# Altium footprint library PcbLib.PcbLib: 141 footprints (part 9 of 9)
Each footprint in its own frame and in the unit in brackets; x right, y up, seen from the top. Pads: shape width x height; smd on the part's side, far side on the other; paste and mask are expansions set on the pad; w line width, h text height; cw(c..) or ccw(c..) is an arc to the next point about the centre after c.
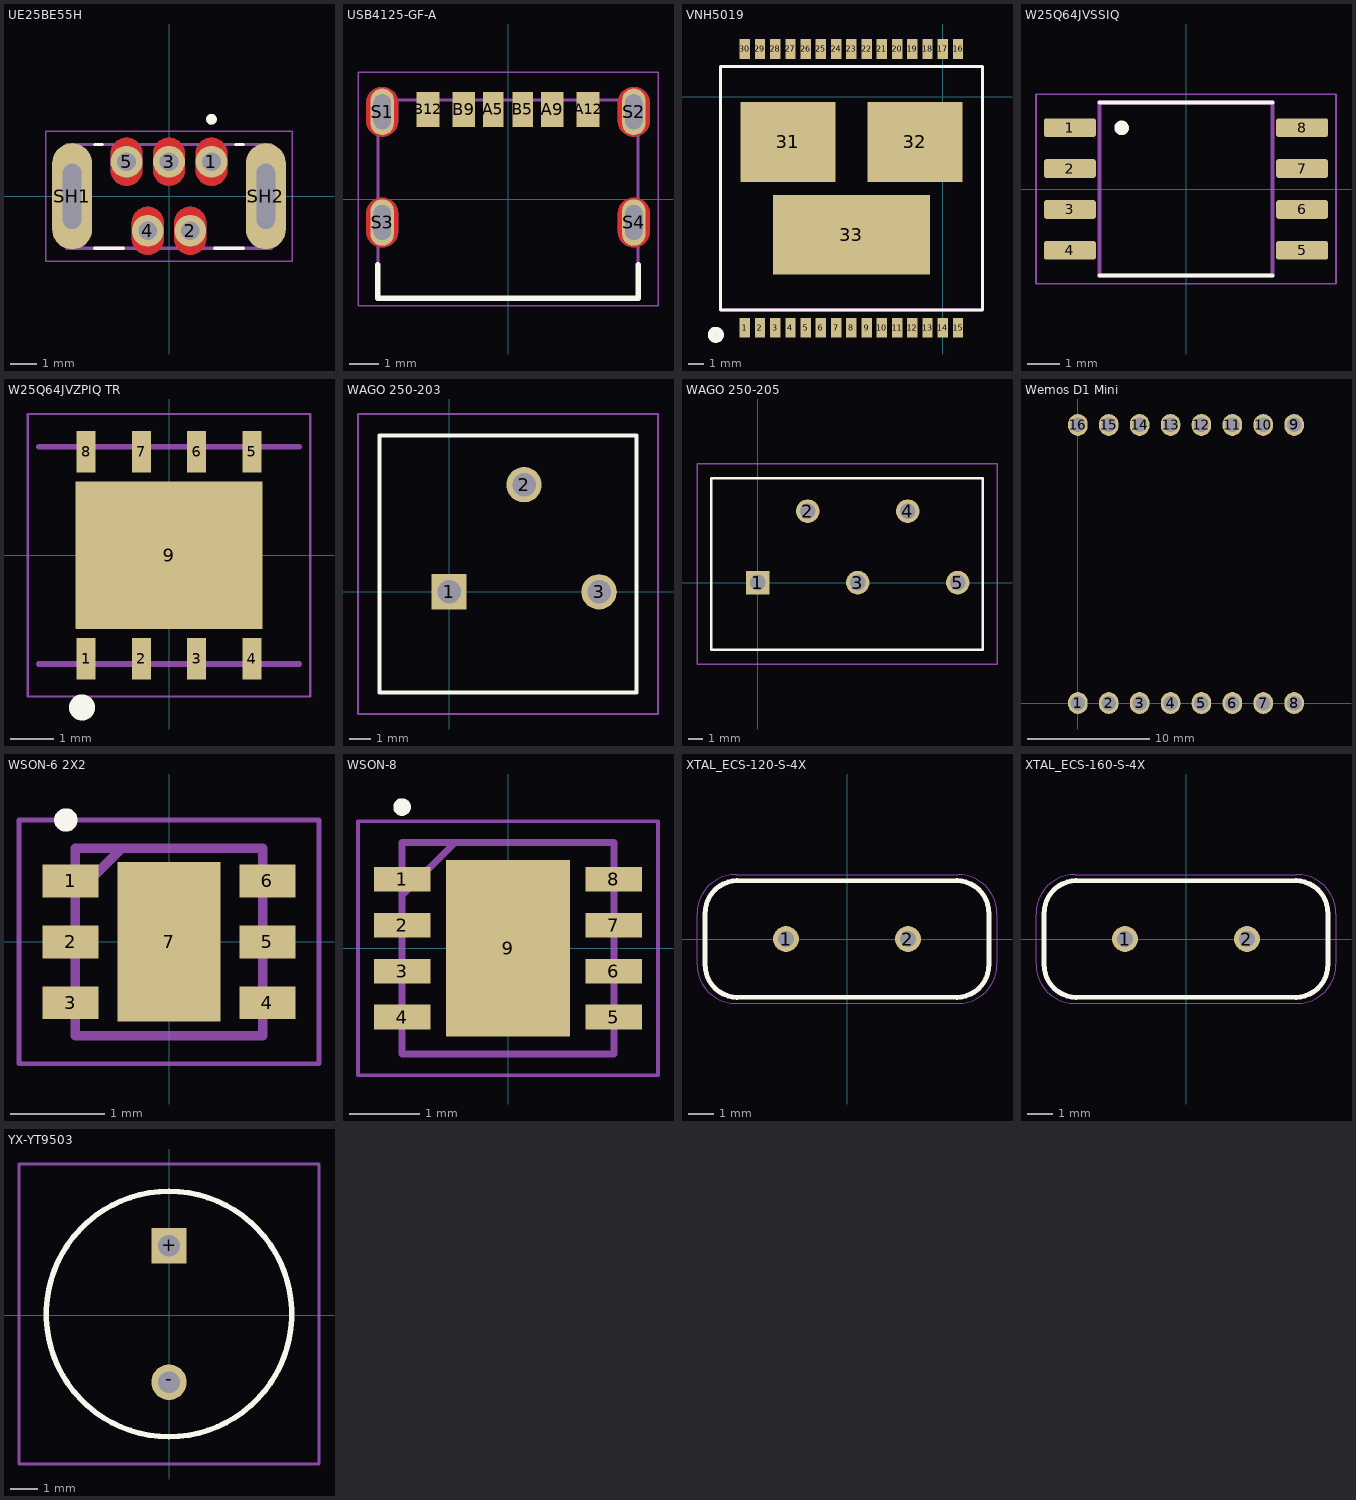
[diagram p8: the footprints below, top view; thin cyan lines are the x and y axes]

## UE25BE55H [mm]
pads (7):
  round 1.2 hole 0.7 mask+0: 1(1.6,1.3) 2(0.8,-1.3) 3(0,1.3) 4(-0.8,-1.3) 5(-1.6,1.3)
  oval 1.5x4 hole 0.7 slot 2.45 at 90 deg: SH1(-3.65,0) SH2(3.65,0)
Top Layer:
  region: 0.831,-0.401 0.863,-0.403 0.894,-0.407 0.925,-0.413 0.955,-0.42 0.985,-0.429 1.015,-0.44 1.044,-0.452 1.072,-0.465 1.1,-0.48 1.127,-0.497 1.153,-0.515 1.178,-0.534 1.201,-0.554 1.224,-0.576 1.246,-0.599 1.266,-0.622 1.285,-0.647 1.303,-0.673 1.32,-0.7 1.335,-0.728 1.348,-0.756 1.36,-0.785 1.371,-0.815 1.38,-0.845 1.387,-0.875 1.393,-0.906 1.397,-0.937 1.399,-0.969 1.4,-1 1.4,-1.6 1.399,-1.631 1.397,-1.663 1.393,-1.694 1.387,-1.725 1.38,-1.755 1.371,-1.785 1.36,-1.815 1.348,-1.844 1.335,-1.872 1.32,-1.9 1.303,-1.927 1.285,-1.953 1.266,-1.978 1.246,-2.001 1.224,-2.024 1.201,-2.046 1.178,-2.066 1.153,-2.085 1.127,-2.103 1.1,-2.12 1.072,-2.135 1.044,-2.148 1.015,-2.16 0.985,-2.171 0.955,-2.18 0.925,-2.187 0.894,-2.193 0.863,-2.197 0.831,-2.199 0.8,-2.2 0.769,-2.199 0.737,-2.197 0.706,-2.193 0.675,-2.187 0.645,-2.18 0.615,-2.171 0.585,-2.16 0.556,-2.148 0.528,-2.135 0.5,-2.12 0.473,-2.103 0.447,-2.085 0.422,-2.066 0.399,-2.046 0.376,-2.024 0.354,-2.001 0.334,-1.978 0.315,-1.953 0.297,-1.927 0.28,-1.9 0.265,-1.872 0.252,-1.844 0.24,-1.815 0.229,-1.785 0.22,-1.755 0.213,-1.725 0.207,-1.694 0.203,-1.663 0.201,-1.631 0.2,-1.6 0.2,-1 0.201,-0.969 0.203,-0.937 0.207,-0.906 0.213,-0.875 0.22,-0.845 0.229,-0.815 0.24,-0.785 0.252,-0.756 0.265,-0.728 0.28,-0.7 0.297,-0.673 0.315,-0.647 0.334,-0.622 0.354,-0.599 0.376,-0.576 0.399,-0.554 0.422,-0.534 0.447,-0.515 0.473,-0.497 0.5,-0.48 0.528,-0.465 0.556,-0.452 0.585,-0.44 0.615,-0.429 0.645,-0.42 0.675,-0.413 0.706,-0.407 0.737,-0.403 0.769,-0.401 0.8,-0.4
  region: -0.769,-0.401 -0.737,-0.403 -0.706,-0.407 -0.675,-0.413 -0.645,-0.42 -0.615,-0.429 -0.585,-0.44 -0.556,-0.452 -0.528,-0.465 -0.5,-0.48 -0.473,-0.497 -0.447,-0.515 -0.422,-0.534 -0.399,-0.554 -0.376,-0.576 -0.354,-0.599 -0.334,-0.622 -0.315,-0.647 -0.297,-0.673 -0.28,-0.7 -0.265,-0.728 -0.252,-0.756 -0.24,-0.785 -0.229,-0.815 -0.22,-0.845 -0.213,-0.875 -0.207,-0.906 -0.203,-0.937 -0.201,-0.969 -0.2,-1 -0.2,-1.6 -0.201,-1.631 -0.203,-1.663 -0.207,-1.694 -0.213,-1.725 -0.22,-1.755 -0.229,-1.785 -0.24,-1.815 -0.252,-1.844 -0.265,-1.872 -0.28,-1.9 -0.297,-1.927 -0.315,-1.953 -0.334,-1.978 -0.354,-2.001 -0.376,-2.024 -0.399,-2.046 -0.422,-2.066 -0.447,-2.085 -0.473,-2.103 -0.5,-2.12 -0.528,-2.135 -0.556,-2.148 -0.585,-2.16 -0.615,-2.171 -0.645,-2.18 -0.675,-2.187 -0.706,-2.193 -0.737,-2.197 -0.769,-2.199 -0.8,-2.2 -0.831,-2.199 -0.863,-2.197 -0.894,-2.193 -0.925,-2.187 -0.955,-2.18 -0.985,-2.171 -1.015,-2.16 -1.044,-2.148 -1.072,-2.135 -1.1,-2.12 -1.127,-2.103 -1.153,-2.085 -1.178,-2.066 -1.201,-2.046 -1.224,-2.024 -1.246,-2.001 -1.266,-1.978 -1.285,-1.953 -1.303,-1.927 -1.32,-1.9 -1.335,-1.872 -1.348,-1.844 -1.36,-1.815 -1.371,-1.785 -1.38,-1.755 -1.387,-1.725 -1.393,-1.694 -1.397,-1.663 -1.399,-1.631 -1.4,-1.6 -1.4,-1 -1.399,-0.969 -1.397,-0.937 -1.393,-0.906 -1.387,-0.875 -1.38,-0.845 -1.371,-0.815 -1.36,-0.785 -1.348,-0.756 -1.335,-0.728 -1.32,-0.7 -1.303,-0.673 -1.285,-0.647 -1.266,-0.622 -1.246,-0.599 -1.224,-0.576 -1.201,-0.554 -1.178,-0.534 -1.153,-0.515 -1.127,-0.497 -1.1,-0.48 -1.072,-0.465 -1.044,-0.452 -1.015,-0.44 -0.985,-0.429 -0.955,-0.42 -0.925,-0.413 -0.894,-0.407 -0.863,-0.403 -0.831,-0.401 -0.8,-0.4
  region: 1.631,2.199 1.663,2.197 1.694,2.193 1.725,2.187 1.755,2.18 1.785,2.171 1.815,2.16 1.844,2.148 1.872,2.135 1.9,2.12 1.927,2.103 1.953,2.085 1.978,2.066 2.001,2.046 2.024,2.024 2.046,2.001 2.066,1.978 2.085,1.953 2.103,1.927 2.12,1.9 2.135,1.872 2.148,1.844 2.16,1.815 2.171,1.785 2.18,1.755 2.187,1.725 2.193,1.694 2.197,1.663 2.199,1.631 2.2,1.6 2.2,1 2.199,0.969 2.197,0.937 2.193,0.906 2.187,0.875 2.18,0.845 2.171,0.815 2.16,0.785 2.148,0.756 2.135,0.728 2.12,0.7 2.103,0.673 2.085,0.647 2.066,0.622 2.046,0.599 2.024,0.576 2.001,0.554 1.978,0.534 1.953,0.515 1.927,0.497 1.9,0.48 1.872,0.465 1.844,0.452 1.815,0.44 1.785,0.429 1.755,0.42 1.725,0.413 1.694,0.407 1.663,0.403 1.631,0.401 1.6,0.4 1.569,0.401 1.537,0.403 1.506,0.407 1.475,0.413 1.445,0.42 1.415,0.429 1.385,0.44 1.356,0.452 1.328,0.465 1.3,0.48 1.273,0.497 1.247,0.515 1.222,0.534 1.199,0.554 1.176,0.576 1.154,0.599 1.134,0.622 1.115,0.647 1.097,0.673 1.08,0.7 1.065,0.728 1.052,0.756 1.04,0.785 1.029,0.815 1.02,0.845 1.013,0.875 1.007,0.906 1.003,0.937 1.001,0.969 1,1 1,1.6 1.001,1.631 1.003,1.663 1.007,1.694 1.013,1.725 1.02,1.755 1.029,1.785 1.04,1.815 1.052,1.844 1.065,1.872 1.08,1.9 1.097,1.927 1.115,1.953 1.134,1.978 1.154,2.001 1.176,2.024 1.199,2.046 1.222,2.066 1.247,2.085 1.273,2.103 1.3,2.12 1.328,2.135 1.356,2.148 1.385,2.16 1.415,2.171 1.445,2.18 1.475,2.187 1.506,2.193 1.537,2.197 1.569,2.199 1.6,2.2
  region: -1.569,2.199 -1.537,2.197 -1.506,2.193 -1.475,2.187 -1.445,2.18 -1.415,2.171 -1.385,2.16 -1.356,2.148 -1.328,2.135 -1.3,2.12 -1.273,2.103 -1.247,2.085 -1.222,2.066 -1.199,2.046 -1.176,2.024 -1.154,2.001 -1.134,1.978 -1.115,1.953 -1.097,1.927 -1.08,1.9 -1.065,1.872 -1.052,1.844 -1.04,1.815 -1.029,1.785 -1.02,1.755 -1.013,1.725 -1.007,1.694 -1.003,1.663 -1.001,1.631 -1,1.6 -1,1 -1.001,0.969 -1.003,0.937 -1.007,0.906 -1.013,0.875 -1.02,0.845 -1.029,0.815 -1.04,0.785 -1.052,0.756 -1.065,0.728 -1.08,0.7 -1.097,0.673 -1.115,0.647 -1.134,0.622 -1.154,0.599 -1.176,0.576 -1.199,0.554 -1.222,0.534 -1.247,0.515 -1.273,0.497 -1.3,0.48 -1.328,0.465 -1.356,0.452 -1.385,0.44 -1.415,0.429 -1.445,0.42 -1.475,0.413 -1.506,0.407 -1.537,0.403 -1.569,0.401 -1.6,0.4 -1.631,0.401 -1.663,0.403 -1.694,0.407 -1.725,0.413 -1.755,0.42 -1.785,0.429 -1.815,0.44 -1.844,0.452 -1.872,0.465 -1.9,0.48 -1.927,0.497 -1.953,0.515 -1.978,0.534 -2.001,0.554 -2.024,0.576 -2.046,0.599 -2.066,0.622 -2.085,0.647 -2.103,0.673 -2.12,0.7 -2.135,0.728 -2.148,0.756 -2.16,0.785 -2.171,0.815 -2.18,0.845 -2.187,0.875 -2.193,0.906 -2.197,0.937 -2.199,0.969 -2.2,1 -2.2,1.6 -2.199,1.631 -2.197,1.663 -2.193,1.694 -2.187,1.725 -2.18,1.755 -2.171,1.785 -2.16,1.815 -2.148,1.844 -2.135,1.872 -2.12,1.9 -2.103,1.927 -2.085,1.953 -2.066,1.978 -2.046,2.001 -2.024,2.024 -2.001,2.046 -1.978,2.066 -1.953,2.085 -1.927,2.103 -1.9,2.12 -1.872,2.135 -1.844,2.148 -1.815,2.16 -1.785,2.171 -1.755,2.18 -1.725,2.187 -1.694,2.193 -1.663,2.197 -1.631,2.199 -1.6,2.2
  region: 0.031,2.199 0.063,2.197 0.094,2.193 0.125,2.187 0.155,2.18 0.185,2.171 0.215,2.16 0.244,2.148 0.272,2.135 0.3,2.12 0.327,2.103 0.353,2.085 0.378,2.066 0.401,2.046 0.424,2.024 0.446,2.001 0.466,1.978 0.485,1.953 0.503,1.927 0.52,1.9 0.535,1.872 0.548,1.844 0.56,1.815 0.571,1.785 0.58,1.755 0.587,1.725 0.593,1.694 0.597,1.663 0.599,1.631 0.6,1.6 0.6,1 0.599,0.969 0.597,0.937 0.593,0.906 0.587,0.875 0.58,0.845 0.571,0.815 0.56,0.785 0.548,0.756 0.535,0.728 0.52,0.7 0.503,0.673 0.485,0.647 0.466,0.622 0.446,0.599 0.424,0.576 0.401,0.554 0.378,0.534 0.353,0.515 0.327,0.497 0.3,0.48 0.272,0.465 0.244,0.452 0.215,0.44 0.185,0.429 0.155,0.42 0.125,0.413 0.094,0.407 0.063,0.403 0.031,0.401 0,0.4 -0.031,0.401 -0.063,0.403 -0.094,0.407 -0.125,0.413 -0.155,0.42 -0.185,0.429 -0.215,0.44 -0.244,0.452 -0.272,0.465 -0.3,0.48 -0.327,0.497 -0.353,0.515 -0.378,0.534 -0.401,0.554 -0.424,0.576 -0.446,0.599 -0.466,0.622 -0.485,0.647 -0.503,0.673 -0.52,0.7 -0.535,0.728 -0.548,0.756 -0.56,0.785 -0.571,0.815 -0.58,0.845 -0.587,0.875 -0.593,0.906 -0.597,0.937 -0.599,0.969 -0.6,1 -0.6,1.6 -0.599,1.631 -0.597,1.663 -0.593,1.694 -0.587,1.725 -0.58,1.755 -0.571,1.785 -0.56,1.815 -0.548,1.844 -0.535,1.872 -0.52,1.9 -0.503,1.927 -0.485,1.953 -0.466,1.978 -0.446,2.001 -0.424,2.024 -0.401,2.046 -0.378,2.066 -0.353,2.085 -0.327,2.103 -0.3,2.12 -0.272,2.135 -0.244,2.148 -0.215,2.16 -0.185,2.171 -0.155,2.18 -0.125,2.187 -0.094,2.193 -0.063,2.197 -0.031,2.199 0,2.2
Bottom Layer:
  region: 0.831,-0.401 0.863,-0.403 0.894,-0.407 0.925,-0.413 0.955,-0.42 0.985,-0.429 1.015,-0.44 1.044,-0.452 1.072,-0.465 1.1,-0.48 1.127,-0.497 1.153,-0.515 1.178,-0.534 1.201,-0.554 1.224,-0.576 1.246,-0.599 1.266,-0.622 1.285,-0.647 1.303,-0.673 1.32,-0.7 1.335,-0.728 1.348,-0.756 1.36,-0.785 1.371,-0.815 1.38,-0.845 1.387,-0.875 1.393,-0.906 1.397,-0.937 1.399,-0.969 1.4,-1 1.4,-1.6 1.399,-1.631 1.397,-1.663 1.393,-1.694 1.387,-1.725 1.38,-1.755 1.371,-1.785 1.36,-1.815 1.348,-1.844 1.335,-1.872 1.32,-1.9 1.303,-1.927 1.285,-1.953 1.266,-1.978 1.246,-2.001 1.224,-2.024 1.201,-2.046 1.178,-2.066 1.153,-2.085 1.127,-2.103 1.1,-2.12 1.072,-2.135 1.044,-2.148 1.015,-2.16 0.985,-2.171 0.955,-2.18 0.925,-2.187 0.894,-2.193 0.863,-2.197 0.831,-2.199 0.8,-2.2 0.769,-2.199 0.737,-2.197 0.706,-2.193 0.675,-2.187 0.645,-2.18 0.615,-2.171 0.585,-2.16 0.556,-2.148 0.528,-2.135 0.5,-2.12 0.473,-2.103 0.447,-2.085 0.422,-2.066 0.399,-2.046 0.376,-2.024 0.354,-2.001 0.334,-1.978 0.315,-1.953 0.297,-1.927 0.28,-1.9 0.265,-1.872 0.252,-1.844 0.24,-1.815 0.229,-1.785 0.22,-1.755 0.213,-1.725 0.207,-1.694 0.203,-1.663 0.201,-1.631 0.2,-1.6 0.2,-1 0.201,-0.969 0.203,-0.937 0.207,-0.906 0.213,-0.875 0.22,-0.845 0.229,-0.815 0.24,-0.785 0.252,-0.756 0.265,-0.728 0.28,-0.7 0.297,-0.673 0.315,-0.647 0.334,-0.622 0.354,-0.599 0.376,-0.576 0.399,-0.554 0.422,-0.534 0.447,-0.515 0.473,-0.497 0.5,-0.48 0.528,-0.465 0.556,-0.452 0.585,-0.44 0.615,-0.429 0.645,-0.42 0.675,-0.413 0.706,-0.407 0.737,-0.403 0.769,-0.401 0.8,-0.4
  region: -0.769,-0.401 -0.737,-0.403 -0.706,-0.407 -0.675,-0.413 -0.645,-0.42 -0.615,-0.429 -0.585,-0.44 -0.556,-0.452 -0.528,-0.465 -0.5,-0.48 -0.473,-0.497 -0.447,-0.515 -0.422,-0.534 -0.399,-0.554 -0.376,-0.576 -0.354,-0.599 -0.334,-0.622 -0.315,-0.647 -0.297,-0.673 -0.28,-0.7 -0.265,-0.728 -0.252,-0.756 -0.24,-0.785 -0.229,-0.815 -0.22,-0.845 -0.213,-0.875 -0.207,-0.906 -0.203,-0.937 -0.201,-0.969 -0.2,-1 -0.2,-1.6 -0.201,-1.631 -0.203,-1.663 -0.207,-1.694 -0.213,-1.725 -0.22,-1.755 -0.229,-1.785 -0.24,-1.815 -0.252,-1.844 -0.265,-1.872 -0.28,-1.9 -0.297,-1.927 -0.315,-1.953 -0.334,-1.978 -0.354,-2.001 -0.376,-2.024 -0.399,-2.046 -0.422,-2.066 -0.447,-2.085 -0.473,-2.103 -0.5,-2.12 -0.528,-2.135 -0.556,-2.148 -0.585,-2.16 -0.615,-2.171 -0.645,-2.18 -0.675,-2.187 -0.706,-2.193 -0.737,-2.197 -0.769,-2.199 -0.8,-2.2 -0.831,-2.199 -0.863,-2.197 -0.894,-2.193 -0.925,-2.187 -0.955,-2.18 -0.985,-2.171 -1.015,-2.16 -1.044,-2.148 -1.072,-2.135 -1.1,-2.12 -1.127,-2.103 -1.153,-2.085 -1.178,-2.066 -1.201,-2.046 -1.224,-2.024 -1.246,-2.001 -1.266,-1.978 -1.285,-1.953 -1.303,-1.927 -1.32,-1.9 -1.335,-1.872 -1.348,-1.844 -1.36,-1.815 -1.371,-1.785 -1.38,-1.755 -1.387,-1.725 -1.393,-1.694 -1.397,-1.663 -1.399,-1.631 -1.4,-1.6 -1.4,-1 -1.399,-0.969 -1.397,-0.937 -1.393,-0.906 -1.387,-0.875 -1.38,-0.845 -1.371,-0.815 -1.36,-0.785 -1.348,-0.756 -1.335,-0.728 -1.32,-0.7 -1.303,-0.673 -1.285,-0.647 -1.266,-0.622 -1.246,-0.599 -1.224,-0.576 -1.201,-0.554 -1.178,-0.534 -1.153,-0.515 -1.127,-0.497 -1.1,-0.48 -1.072,-0.465 -1.044,-0.452 -1.015,-0.44 -0.985,-0.429 -0.955,-0.42 -0.925,-0.413 -0.894,-0.407 -0.863,-0.403 -0.831,-0.401 -0.8,-0.4
  region: 1.631,2.199 1.663,2.197 1.694,2.193 1.725,2.187 1.755,2.18 1.785,2.171 1.815,2.16 1.844,2.148 1.872,2.135 1.9,2.12 1.927,2.103 1.953,2.085 1.978,2.066 2.001,2.046 2.024,2.024 2.046,2.001 2.066,1.978 2.085,1.953 2.103,1.927 2.12,1.9 2.135,1.872 2.148,1.844 2.16,1.815 2.171,1.785 2.18,1.755 2.187,1.725 2.193,1.694 2.197,1.663 2.199,1.631 2.2,1.6 2.2,1 2.199,0.969 2.197,0.937 2.193,0.906 2.187,0.875 2.18,0.845 2.171,0.815 2.16,0.785 2.148,0.756 2.135,0.728 2.12,0.7 2.103,0.673 2.085,0.647 2.066,0.622 2.046,0.599 2.024,0.576 2.001,0.554 1.978,0.534 1.953,0.515 1.927,0.497 1.9,0.48 1.872,0.465 1.844,0.452 1.815,0.44 1.785,0.429 1.755,0.42 1.725,0.413 1.694,0.407 1.663,0.403 1.631,0.401 1.6,0.4 1.569,0.401 1.537,0.403 1.506,0.407 1.475,0.413 1.445,0.42 1.415,0.429 1.385,0.44 1.356,0.452 1.328,0.465 1.3,0.48 1.273,0.497 1.247,0.515 1.222,0.534 1.199,0.554 1.176,0.576 1.154,0.599 1.134,0.622 1.115,0.647 1.097,0.673 1.08,0.7 1.065,0.728 1.052,0.756 1.04,0.785 1.029,0.815 1.02,0.845 1.013,0.875 1.007,0.906 1.003,0.937 1.001,0.969 1,1 1,1.6 1.001,1.631 1.003,1.663 1.007,1.694 1.013,1.725 1.02,1.755 1.029,1.785 1.04,1.815 1.052,1.844 1.065,1.872 1.08,1.9 1.097,1.927 1.115,1.953 1.134,1.978 1.154,2.001 1.176,2.024 1.199,2.046 1.222,2.066 1.247,2.085 1.273,2.103 1.3,2.12 1.328,2.135 1.356,2.148 1.385,2.16 1.415,2.171 1.445,2.18 1.475,2.187 1.506,2.193 1.537,2.197 1.569,2.199 1.6,2.2
  region: -1.569,2.199 -1.537,2.197 -1.506,2.193 -1.475,2.187 -1.445,2.18 -1.415,2.171 -1.385,2.16 -1.356,2.148 -1.328,2.135 -1.3,2.12 -1.273,2.103 -1.247,2.085 -1.222,2.066 -1.199,2.046 -1.176,2.024 -1.154,2.001 -1.134,1.978 -1.115,1.953 -1.097,1.927 -1.08,1.9 -1.065,1.872 -1.052,1.844 -1.04,1.815 -1.029,1.785 -1.02,1.755 -1.013,1.725 -1.007,1.694 -1.003,1.663 -1.001,1.631 -1,1.6 -1,1 -1.001,0.969 -1.003,0.937 -1.007,0.906 -1.013,0.875 -1.02,0.845 -1.029,0.815 -1.04,0.785 -1.052,0.756 -1.065,0.728 -1.08,0.7 -1.097,0.673 -1.115,0.647 -1.134,0.622 -1.154,0.599 -1.176,0.576 -1.199,0.554 -1.222,0.534 -1.247,0.515 -1.273,0.497 -1.3,0.48 -1.328,0.465 -1.356,0.452 -1.385,0.44 -1.415,0.429 -1.445,0.42 -1.475,0.413 -1.506,0.407 -1.537,0.403 -1.569,0.401 -1.6,0.4 -1.631,0.401 -1.663,0.403 -1.694,0.407 -1.725,0.413 -1.755,0.42 -1.785,0.429 -1.815,0.44 -1.844,0.452 -1.872,0.465 -1.9,0.48 -1.927,0.497 -1.953,0.515 -1.978,0.534 -2.001,0.554 -2.024,0.576 -2.046,0.599 -2.066,0.622 -2.085,0.647 -2.103,0.673 -2.12,0.7 -2.135,0.728 -2.148,0.756 -2.16,0.785 -2.171,0.815 -2.18,0.845 -2.187,0.875 -2.193,0.906 -2.197,0.937 -2.199,0.969 -2.2,1 -2.2,1.6 -2.199,1.631 -2.197,1.663 -2.193,1.694 -2.187,1.725 -2.18,1.755 -2.171,1.785 -2.16,1.815 -2.148,1.844 -2.135,1.872 -2.12,1.9 -2.103,1.927 -2.085,1.953 -2.066,1.978 -2.046,2.001 -2.024,2.024 -2.001,2.046 -1.978,2.066 -1.953,2.085 -1.927,2.103 -1.9,2.12 -1.872,2.135 -1.844,2.148 -1.815,2.16 -1.785,2.171 -1.755,2.18 -1.725,2.187 -1.694,2.193 -1.663,2.197 -1.631,2.199 -1.6,2.2
  region: 0.031,2.199 0.063,2.197 0.094,2.193 0.125,2.187 0.155,2.18 0.185,2.171 0.215,2.16 0.244,2.148 0.272,2.135 0.3,2.12 0.327,2.103 0.353,2.085 0.378,2.066 0.401,2.046 0.424,2.024 0.446,2.001 0.466,1.978 0.485,1.953 0.503,1.927 0.52,1.9 0.535,1.872 0.548,1.844 0.56,1.815 0.571,1.785 0.58,1.755 0.587,1.725 0.593,1.694 0.597,1.663 0.599,1.631 0.6,1.6 0.6,1 0.599,0.969 0.597,0.937 0.593,0.906 0.587,0.875 0.58,0.845 0.571,0.815 0.56,0.785 0.548,0.756 0.535,0.728 0.52,0.7 0.503,0.673 0.485,0.647 0.466,0.622 0.446,0.599 0.424,0.576 0.401,0.554 0.378,0.534 0.353,0.515 0.327,0.497 0.3,0.48 0.272,0.465 0.244,0.452 0.215,0.44 0.185,0.429 0.155,0.42 0.125,0.413 0.094,0.407 0.063,0.403 0.031,0.401 0,0.4 -0.031,0.401 -0.063,0.403 -0.094,0.407 -0.125,0.413 -0.155,0.42 -0.185,0.429 -0.215,0.44 -0.244,0.452 -0.272,0.465 -0.3,0.48 -0.327,0.497 -0.353,0.515 -0.378,0.534 -0.401,0.554 -0.424,0.576 -0.446,0.599 -0.466,0.622 -0.485,0.647 -0.503,0.673 -0.52,0.7 -0.535,0.728 -0.548,0.756 -0.56,0.785 -0.571,0.815 -0.58,0.845 -0.587,0.875 -0.593,0.906 -0.597,0.937 -0.599,0.969 -0.6,1 -0.6,1.6 -0.599,1.631 -0.597,1.663 -0.593,1.694 -0.587,1.725 -0.58,1.755 -0.571,1.785 -0.56,1.815 -0.548,1.844 -0.535,1.872 -0.52,1.9 -0.503,1.927 -0.485,1.953 -0.466,1.978 -0.446,2.001 -0.424,2.024 -0.401,2.046 -0.378,2.066 -0.353,2.085 -0.327,2.103 -0.3,2.12 -0.272,2.135 -0.244,2.148 -0.215,2.16 -0.185,2.171 -0.155,2.18 -0.125,2.187 -0.094,2.193 -0.063,2.197 -0.031,2.199 0,2.2
Top Overlay:
  circle w0.2: c1.6,2.9 r0.1
  lines w0.127: -2.8,-1.95 -1.72,-1.95 ; -2.8,1.95 -2.52,1.95 ; 1.72,-1.95 2.8,-1.95 ; 2.52,1.95 2.8,1.95
Top Solder:
  drawing of 5 lines, arcs and shapes, not listed
Bottom Solder:
  drawing of 5 lines, arcs and shapes, not listed
Mechanical 13:
  circle w0.2: c1.6,2.9 r0.1
  lines w0.127: -3.85,-1.95 -3.85,1.95 3.85,1.95 3.85,-1.95 -3.85,-1.95
Mechanical 15:
  lines w0.05: -4.65,-2.45 4.65,-2.45 4.65,2.45 -4.65,2.45 -4.65,-2.45
3D body "UE25BE5510H.step": height 7.7, standoff -2.1, extent -3.85,-1.95 3.85,1.95

## USB4125-GF-A [mm]
pads (10):
  rect 0.7x1.2 smd: A5(-0.5,3.08) B5(0.5,3.08)
  rect 0.76x1.2 smd: A9(1.52,3.08) B9(-1.52,3.08)
  rect 0.8x1.2 smd: A12(2.75,3.08) B12(-2.75,3.08)
  oval 0.8x1.6 hole 0.6 slot 1.2 at 90 deg mask+0: S1(-4.32,3) S2(4.32,3) S3(-4.32,-0.8) S4(4.32,-0.8)
Top Layer:
  region: 4.349,3.849 4.377,3.847 4.406,3.843 4.434,3.838 4.462,3.831 4.49,3.823 4.517,3.813 4.544,3.802 4.57,3.79 4.595,3.776 4.62,3.761 4.643,3.745 4.666,3.727 4.688,3.709 4.709,3.689 4.729,3.668 4.747,3.646 4.765,3.623 4.781,3.6 4.796,3.575 4.81,3.55 4.822,3.524 4.833,3.497 4.843,3.47 4.851,3.442 4.858,3.414 4.863,3.386 4.867,3.357 4.869,3.329 4.87,3.3 4.87,2.7 4.869,2.671 4.867,2.643 4.863,2.614 4.858,2.586 4.851,2.558 4.843,2.53 4.833,2.503 4.822,2.476 4.81,2.45 4.796,2.425 4.781,2.4 4.765,2.377 4.747,2.354 4.729,2.332 4.709,2.311 4.688,2.291 4.666,2.273 4.643,2.255 4.62,2.239 4.595,2.224 4.57,2.21 4.544,2.198 4.517,2.187 4.49,2.177 4.462,2.169 4.434,2.162 4.406,2.157 4.377,2.153 4.349,2.151 4.32,2.15 4.291,2.151 4.263,2.153 4.234,2.157 4.206,2.162 4.178,2.169 4.15,2.177 4.123,2.187 4.096,2.198 4.07,2.21 4.045,2.224 4.02,2.239 3.997,2.255 3.974,2.273 3.952,2.291 3.931,2.311 3.911,2.332 3.893,2.354 3.875,2.377 3.859,2.4 3.844,2.425 3.83,2.45 3.818,2.476 3.807,2.503 3.797,2.53 3.789,2.558 3.782,2.586 3.777,2.614 3.773,2.643 3.771,2.671 3.77,2.7 3.77,3.3 3.771,3.329 3.773,3.357 3.777,3.386 3.782,3.414 3.789,3.442 3.797,3.47 3.807,3.497 3.818,3.524 3.83,3.55 3.844,3.575 3.859,3.6 3.875,3.623 3.893,3.646 3.911,3.668 3.931,3.689 3.952,3.709 3.974,3.727 3.997,3.745 4.02,3.761 4.045,3.776 4.07,3.79 4.096,3.802 4.123,3.813 4.15,3.823 4.178,3.831 4.206,3.838 4.234,3.843 4.263,3.847 4.291,3.849 4.32,3.85
  region: -4.291,3.849 -4.263,3.847 -4.234,3.843 -4.206,3.838 -4.178,3.831 -4.15,3.823 -4.123,3.813 -4.096,3.802 -4.07,3.79 -4.045,3.776 -4.02,3.761 -3.997,3.745 -3.974,3.727 -3.952,3.709 -3.931,3.689 -3.911,3.668 -3.893,3.646 -3.875,3.623 -3.859,3.6 -3.844,3.575 -3.83,3.55 -3.818,3.524 -3.807,3.497 -3.797,3.47 -3.789,3.442 -3.782,3.414 -3.777,3.386 -3.773,3.357 -3.771,3.329 -3.77,3.3 -3.77,2.7 -3.771,2.671 -3.773,2.643 -3.777,2.614 -3.782,2.586 -3.789,2.558 -3.797,2.53 -3.807,2.503 -3.818,2.476 -3.83,2.45 -3.844,2.425 -3.859,2.4 -3.875,2.377 -3.893,2.354 -3.911,2.332 -3.931,2.311 -3.952,2.291 -3.974,2.273 -3.997,2.255 -4.02,2.239 -4.045,2.224 -4.07,2.21 -4.096,2.198 -4.123,2.187 -4.15,2.177 -4.178,2.169 -4.206,2.162 -4.234,2.157 -4.263,2.153 -4.291,2.151 -4.32,2.15 -4.349,2.151 -4.377,2.153 -4.406,2.157 -4.434,2.162 -4.462,2.169 -4.49,2.177 -4.517,2.187 -4.544,2.198 -4.57,2.21 -4.595,2.224 -4.62,2.239 -4.643,2.255 -4.666,2.273 -4.688,2.291 -4.709,2.311 -4.729,2.332 -4.747,2.354 -4.765,2.377 -4.781,2.4 -4.796,2.425 -4.81,2.45 -4.822,2.476 -4.833,2.503 -4.843,2.53 -4.851,2.558 -4.858,2.586 -4.863,2.614 -4.867,2.643 -4.869,2.671 -4.87,2.7 -4.87,3.3 -4.869,3.329 -4.867,3.357 -4.863,3.386 -4.858,3.414 -4.851,3.442 -4.843,3.47 -4.833,3.497 -4.822,3.524 -4.81,3.55 -4.796,3.575 -4.781,3.6 -4.765,3.623 -4.747,3.646 -4.729,3.668 -4.709,3.689 -4.688,3.709 -4.666,3.727 -4.643,3.745 -4.62,3.761 -4.595,3.776 -4.57,3.79 -4.544,3.802 -4.517,3.813 -4.49,3.823 -4.462,3.831 -4.434,3.838 -4.406,3.843 -4.377,3.847 -4.349,3.849 -4.32,3.85
  region: 4.349,0.049 4.377,0.047 4.406,0.043 4.434,0.038 4.462,0.031 4.49,0.023 4.517,0.013 4.544,0.002 4.57,-0.01 4.595,-0.024 4.62,-0.039 4.643,-0.055 4.666,-0.073 4.688,-0.091 4.709,-0.111 4.729,-0.132 4.747,-0.154 4.765,-0.177 4.781,-0.2 4.796,-0.225 4.81,-0.25 4.822,-0.276 4.833,-0.303 4.843,-0.33 4.851,-0.358 4.858,-0.386 4.863,-0.414 4.867,-0.443 4.869,-0.471 4.87,-0.5 4.87,-1.1 4.869,-1.129 4.867,-1.157 4.863,-1.186 4.858,-1.214 4.851,-1.242 4.843,-1.27 4.833,-1.297 4.822,-1.324 4.81,-1.35 4.796,-1.375 4.781,-1.4 4.765,-1.423 4.747,-1.446 4.729,-1.468 4.709,-1.489 4.688,-1.509 4.666,-1.527 4.643,-1.545 4.62,-1.561 4.595,-1.576 4.57,-1.59 4.544,-1.602 4.517,-1.613 4.49,-1.623 4.462,-1.631 4.434,-1.638 4.406,-1.643 4.377,-1.647 4.349,-1.649 4.32,-1.65 4.291,-1.649 4.263,-1.647 4.234,-1.643 4.206,-1.638 4.178,-1.631 4.15,-1.623 4.123,-1.613 4.096,-1.602 4.07,-1.59 4.045,-1.576 4.02,-1.561 3.997,-1.545 3.974,-1.527 3.952,-1.509 3.931,-1.489 3.911,-1.468 3.893,-1.446 3.875,-1.423 3.859,-1.4 3.844,-1.375 3.83,-1.35 3.818,-1.324 3.807,-1.297 3.797,-1.27 3.789,-1.242 3.782,-1.214 3.777,-1.186 3.773,-1.157 3.771,-1.129 3.77,-1.1 3.77,-0.5 3.771,-0.471 3.773,-0.443 3.777,-0.414 3.782,-0.386 3.789,-0.358 3.797,-0.33 3.807,-0.303 3.818,-0.276 3.83,-0.25 3.844,-0.225 3.859,-0.2 3.875,-0.177 3.893,-0.154 3.911,-0.132 3.931,-0.111 3.952,-0.091 3.974,-0.073 3.997,-0.055 4.02,-0.039 4.045,-0.024 4.07,-0.01 4.096,0.002 4.123,0.013 4.15,0.023 4.178,0.031 4.206,0.038 4.234,0.043 4.263,0.047 4.291,0.049 4.32,0.05
  region: -4.291,0.049 -4.263,0.047 -4.234,0.043 -4.206,0.038 -4.178,0.031 -4.15,0.023 -4.123,0.013 -4.096,0.002 -4.07,-0.01 -4.045,-0.024 -4.02,-0.039 -3.997,-0.055 -3.974,-0.073 -3.952,-0.091 -3.931,-0.111 -3.911,-0.132 -3.893,-0.154 -3.875,-0.177 -3.859,-0.2 -3.844,-0.225 -3.83,-0.25 -3.818,-0.276 -3.807,-0.303 -3.797,-0.33 -3.789,-0.358 -3.782,-0.386 -3.777,-0.414 -3.773,-0.443 -3.771,-0.471 -3.77,-0.5 -3.77,-1.1 -3.771,-1.129 -3.773,-1.157 -3.777,-1.186 -3.782,-1.214 -3.789,-1.242 -3.797,-1.27 -3.807,-1.297 -3.818,-1.324 -3.83,-1.35 -3.844,-1.375 -3.859,-1.4 -3.875,-1.423 -3.893,-1.446 -3.911,-1.468 -3.931,-1.489 -3.952,-1.509 -3.974,-1.527 -3.997,-1.545 -4.02,-1.561 -4.045,-1.576 -4.07,-1.59 -4.096,-1.602 -4.123,-1.613 -4.15,-1.623 -4.178,-1.631 -4.206,-1.638 -4.234,-1.643 -4.263,-1.647 -4.291,-1.649 -4.32,-1.65 -4.349,-1.649 -4.377,-1.647 -4.406,-1.643 -4.434,-1.638 -4.462,-1.631 -4.49,-1.623 -4.517,-1.613 -4.544,-1.602 -4.57,-1.59 -4.595,-1.576 -4.62,-1.561 -4.643,-1.545 -4.666,-1.527 -4.688,-1.509 -4.709,-1.489 -4.729,-1.468 -4.747,-1.446 -4.765,-1.423 -4.781,-1.4 -4.796,-1.375 -4.81,-1.35 -4.822,-1.324 -4.833,-1.297 -4.843,-1.27 -4.851,-1.242 -4.858,-1.214 -4.863,-1.186 -4.867,-1.157 -4.869,-1.129 -4.87,-1.1 -4.87,-0.5 -4.869,-0.471 -4.867,-0.443 -4.863,-0.414 -4.858,-0.386 -4.851,-0.358 -4.843,-0.33 -4.833,-0.303 -4.822,-0.276 -4.81,-0.25 -4.796,-0.225 -4.781,-0.2 -4.765,-0.177 -4.747,-0.154 -4.729,-0.132 -4.709,-0.111 -4.688,-0.091 -4.666,-0.073 -4.643,-0.055 -4.62,-0.039 -4.595,-0.024 -4.57,-0.01 -4.544,0.002 -4.517,0.013 -4.49,0.023 -4.462,0.031 -4.434,0.038 -4.406,0.043 -4.377,0.047 -4.349,0.049 -4.32,0.05
Bottom Layer:
  region: 4.349,3.849 4.377,3.847 4.406,3.843 4.434,3.838 4.462,3.831 4.49,3.823 4.517,3.813 4.544,3.802 4.57,3.79 4.595,3.776 4.62,3.761 4.643,3.745 4.666,3.727 4.688,3.709 4.709,3.689 4.729,3.668 4.747,3.646 4.765,3.623 4.781,3.6 4.796,3.575 4.81,3.55 4.822,3.524 4.833,3.497 4.843,3.47 4.851,3.442 4.858,3.414 4.863,3.386 4.867,3.357 4.869,3.329 4.87,3.3 4.87,2.7 4.869,2.671 4.867,2.643 4.863,2.614 4.858,2.586 4.851,2.558 4.843,2.53 4.833,2.503 4.822,2.476 4.81,2.45 4.796,2.425 4.781,2.4 4.765,2.377 4.747,2.354 4.729,2.332 4.709,2.311 4.688,2.291 4.666,2.273 4.643,2.255 4.62,2.239 4.595,2.224 4.57,2.21 4.544,2.198 4.517,2.187 4.49,2.177 4.462,2.169 4.434,2.162 4.406,2.157 4.377,2.153 4.349,2.151 4.32,2.15 4.291,2.151 4.263,2.153 4.234,2.157 4.206,2.162 4.178,2.169 4.15,2.177 4.123,2.187 4.096,2.198 4.07,2.21 4.045,2.224 4.02,2.239 3.997,2.255 3.974,2.273 3.952,2.291 3.931,2.311 3.911,2.332 3.893,2.354 3.875,2.377 3.859,2.4 3.844,2.425 3.83,2.45 3.818,2.476 3.807,2.503 3.797,2.53 3.789,2.558 3.782,2.586 3.777,2.614 3.773,2.643 3.771,2.671 3.77,2.7 3.77,3.3 3.771,3.329 3.773,3.357 3.777,3.386 3.782,3.414 3.789,3.442 3.797,3.47 3.807,3.497 3.818,3.524 3.83,3.55 3.844,3.575 3.859,3.6 3.875,3.623 3.893,3.646 3.911,3.668 3.931,3.689 3.952,3.709 3.974,3.727 3.997,3.745 4.02,3.761 4.045,3.776 4.07,3.79 4.096,3.802 4.123,3.813 4.15,3.823 4.178,3.831 4.206,3.838 4.234,3.843 4.263,3.847 4.291,3.849 4.32,3.85
  region: -4.291,3.849 -4.263,3.847 -4.234,3.843 -4.206,3.838 -4.178,3.831 -4.15,3.823 -4.123,3.813 -4.096,3.802 -4.07,3.79 -4.045,3.776 -4.02,3.761 -3.997,3.745 -3.974,3.727 -3.952,3.709 -3.931,3.689 -3.911,3.668 -3.893,3.646 -3.875,3.623 -3.859,3.6 -3.844,3.575 -3.83,3.55 -3.818,3.524 -3.807,3.497 -3.797,3.47 -3.789,3.442 -3.782,3.414 -3.777,3.386 -3.773,3.357 -3.771,3.329 -3.77,3.3 -3.77,2.7 -3.771,2.671 -3.773,2.643 -3.777,2.614 -3.782,2.586 -3.789,2.558 -3.797,2.53 -3.807,2.503 -3.818,2.476 -3.83,2.45 -3.844,2.425 -3.859,2.4 -3.875,2.377 -3.893,2.354 -3.911,2.332 -3.931,2.311 -3.952,2.291 -3.974,2.273 -3.997,2.255 -4.02,2.239 -4.045,2.224 -4.07,2.21 -4.096,2.198 -4.123,2.187 -4.15,2.177 -4.178,2.169 -4.206,2.162 -4.234,2.157 -4.263,2.153 -4.291,2.151 -4.32,2.15 -4.349,2.151 -4.377,2.153 -4.406,2.157 -4.434,2.162 -4.462,2.169 -4.49,2.177 -4.517,2.187 -4.544,2.198 -4.57,2.21 -4.595,2.224 -4.62,2.239 -4.643,2.255 -4.666,2.273 -4.688,2.291 -4.709,2.311 -4.729,2.332 -4.747,2.354 -4.765,2.377 -4.781,2.4 -4.796,2.425 -4.81,2.45 -4.822,2.476 -4.833,2.503 -4.843,2.53 -4.851,2.558 -4.858,2.586 -4.863,2.614 -4.867,2.643 -4.869,2.671 -4.87,2.7 -4.87,3.3 -4.869,3.329 -4.867,3.357 -4.863,3.386 -4.858,3.414 -4.851,3.442 -4.843,3.47 -4.833,3.497 -4.822,3.524 -4.81,3.55 -4.796,3.575 -4.781,3.6 -4.765,3.623 -4.747,3.646 -4.729,3.668 -4.709,3.689 -4.688,3.709 -4.666,3.727 -4.643,3.745 -4.62,3.761 -4.595,3.776 -4.57,3.79 -4.544,3.802 -4.517,3.813 -4.49,3.823 -4.462,3.831 -4.434,3.838 -4.406,3.843 -4.377,3.847 -4.349,3.849 -4.32,3.85
  region: 4.349,0.049 4.377,0.047 4.406,0.043 4.434,0.038 4.462,0.031 4.49,0.023 4.517,0.013 4.544,0.002 4.57,-0.01 4.595,-0.024 4.62,-0.039 4.643,-0.055 4.666,-0.073 4.688,-0.091 4.709,-0.111 4.729,-0.132 4.747,-0.154 4.765,-0.177 4.781,-0.2 4.796,-0.225 4.81,-0.25 4.822,-0.276 4.833,-0.303 4.843,-0.33 4.851,-0.358 4.858,-0.386 4.863,-0.414 4.867,-0.443 4.869,-0.471 4.87,-0.5 4.87,-1.1 4.869,-1.129 4.867,-1.157 4.863,-1.186 4.858,-1.214 4.851,-1.242 4.843,-1.27 4.833,-1.297 4.822,-1.324 4.81,-1.35 4.796,-1.375 4.781,-1.4 4.765,-1.423 4.747,-1.446 4.729,-1.468 4.709,-1.489 4.688,-1.509 4.666,-1.527 4.643,-1.545 4.62,-1.561 4.595,-1.576 4.57,-1.59 4.544,-1.602 4.517,-1.613 4.49,-1.623 4.462,-1.631 4.434,-1.638 4.406,-1.643 4.377,-1.647 4.349,-1.649 4.32,-1.65 4.291,-1.649 4.263,-1.647 4.234,-1.643 4.206,-1.638 4.178,-1.631 4.15,-1.623 4.123,-1.613 4.096,-1.602 4.07,-1.59 4.045,-1.576 4.02,-1.561 3.997,-1.545 3.974,-1.527 3.952,-1.509 3.931,-1.489 3.911,-1.468 3.893,-1.446 3.875,-1.423 3.859,-1.4 3.844,-1.375 3.83,-1.35 3.818,-1.324 3.807,-1.297 3.797,-1.27 3.789,-1.242 3.782,-1.214 3.777,-1.186 3.773,-1.157 3.771,-1.129 3.77,-1.1 3.77,-0.5 3.771,-0.471 3.773,-0.443 3.777,-0.414 3.782,-0.386 3.789,-0.358 3.797,-0.33 3.807,-0.303 3.818,-0.276 3.83,-0.25 3.844,-0.225 3.859,-0.2 3.875,-0.177 3.893,-0.154 3.911,-0.132 3.931,-0.111 3.952,-0.091 3.974,-0.073 3.997,-0.055 4.02,-0.039 4.045,-0.024 4.07,-0.01 4.096,0.002 4.123,0.013 4.15,0.023 4.178,0.031 4.206,0.038 4.234,0.043 4.263,0.047 4.291,0.049 4.32,0.05
  region: -4.291,0.049 -4.263,0.047 -4.234,0.043 -4.206,0.038 -4.178,0.031 -4.15,0.023 -4.123,0.013 -4.096,0.002 -4.07,-0.01 -4.045,-0.024 -4.02,-0.039 -3.997,-0.055 -3.974,-0.073 -3.952,-0.091 -3.931,-0.111 -3.911,-0.132 -3.893,-0.154 -3.875,-0.177 -3.859,-0.2 -3.844,-0.225 -3.83,-0.25 -3.818,-0.276 -3.807,-0.303 -3.797,-0.33 -3.789,-0.358 -3.782,-0.386 -3.777,-0.414 -3.773,-0.443 -3.771,-0.471 -3.77,-0.5 -3.77,-1.1 -3.771,-1.129 -3.773,-1.157 -3.777,-1.186 -3.782,-1.214 -3.789,-1.242 -3.797,-1.27 -3.807,-1.297 -3.818,-1.324 -3.83,-1.35 -3.844,-1.375 -3.859,-1.4 -3.875,-1.423 -3.893,-1.446 -3.911,-1.468 -3.931,-1.489 -3.952,-1.509 -3.974,-1.527 -3.997,-1.545 -4.02,-1.561 -4.045,-1.576 -4.07,-1.59 -4.096,-1.602 -4.123,-1.613 -4.15,-1.623 -4.178,-1.631 -4.206,-1.638 -4.234,-1.643 -4.263,-1.647 -4.291,-1.649 -4.32,-1.65 -4.349,-1.649 -4.377,-1.647 -4.406,-1.643 -4.434,-1.638 -4.462,-1.631 -4.49,-1.623 -4.517,-1.613 -4.544,-1.602 -4.57,-1.59 -4.595,-1.576 -4.62,-1.561 -4.643,-1.545 -4.666,-1.527 -4.688,-1.509 -4.709,-1.489 -4.729,-1.468 -4.747,-1.446 -4.765,-1.423 -4.781,-1.4 -4.796,-1.375 -4.81,-1.35 -4.822,-1.324 -4.833,-1.297 -4.843,-1.27 -4.851,-1.242 -4.858,-1.214 -4.863,-1.186 -4.867,-1.157 -4.869,-1.129 -4.87,-1.1 -4.87,-0.5 -4.869,-0.471 -4.867,-0.443 -4.863,-0.414 -4.858,-0.386 -4.851,-0.358 -4.843,-0.33 -4.833,-0.303 -4.822,-0.276 -4.81,-0.25 -4.796,-0.225 -4.781,-0.2 -4.765,-0.177 -4.747,-0.154 -4.729,-0.132 -4.709,-0.111 -4.688,-0.091 -4.666,-0.073 -4.643,-0.055 -4.62,-0.039 -4.595,-0.024 -4.57,-0.01 -4.544,0.002 -4.517,0.013 -4.49,0.023 -4.462,0.031 -4.434,0.038 -4.406,0.043 -4.377,0.047 -4.349,0.049 -4.32,0.05
Top Overlay:
  lines w0.2: -4.47,-2.25 -4.47,-3.4 4.47,-3.4 4.47,-2.25
Top Solder:
  drawing of 4 lines, arcs and shapes, not listed
Bottom Solder:
  drawing of 4 lines, arcs and shapes, not listed
Mechanical 13:
  lines w0.1: -4.47,-3.4 -4.47,3.4 4.47,3.4 4.47,-3.4 -4.47,-3.4
Mechanical 15:
  lines w0.05: -5.15,-3.65 -5.15,4.35 5.15,4.35 5.15,-3.65 -5.15,-3.65
3D body "USB4125-GF-A.STEP": height 3.26, standoff -1.25, extent -4.47,-3.45 4.47,3.45

## VNH5019 [mm]
pads (33):
  rect 0.68x1.3 smd: 1(-13,-15.15) 2(-12,-15.15) 3(-11,-15.15) 4(-10,-15.15) 5(-9,-15.15) 6(-8,-15.15) 7(-7,-15.15) 8(-6,-15.15) 9(-5,-15.15) 10(-4,-15.15) 11(-3,-15.15) 12(-2,-15.15) 13(-1,-15.15) 14(0,-15.15) 15(1,-15.15) 16(1,3.15) 17(0,3.15) 18(-1,3.15) 19(-2,3.15) 20(-3,3.15) 21(-4,3.15) 22(-5,3.15) 23(-6,3.15) 24(-7,3.15) 25(-8,3.15) 26(-9,3.15) 27(-10,3.15) 28(-11,3.15) 29(-12,3.15) 30(-13,3.15)
  rect 6.23x5.25 smd: 31(-10.165,-2.95) 32(-1.835,-2.95)
  rect 10.3x5.25 smd: 33(-6,-9.05)
Top Overlay:
  circle w0.5: c-14.899,-15.618 r0.276
  lines w0.2: -14.6,-14 -14.6,2 2.6,2 2.6,-14 -14.6,-14
Mechanical 13:
  lines w0.2: -14.6,-14 -14.6,2 2.6,2 2.6,-14 -14.6,-14
3D body "VNH5019ATR-E.stp": height 1.95, standoff 0.01, extent -14.61,-15.745 2.59,3.405

## W25Q64JVSSIQ [mm] "SPI Flash Memory"
pads (8):
  rrect25% 1.61x0.58 smd: 1(-3.605,1.905) 2(-3.605,0.635) 3(-3.605,-0.635) 4(-3.605,-1.905) 5(3.605,-1.905) 6(3.605,-0.635) 7(3.605,0.635) 8(3.605,1.905)
Top Overlay:
  circle w0.254: c-2,1.9 r0.1
  lines w0.127: -2.69,-2.69 2.69,-2.69 ; -2.69,2.69 2.69,2.69
Mechanical 13:
  circle w0.2: c-2,1.9 r0.1
  lines w0.127: -2.69,-2.69 -2.69,2.69 2.69,2.69 2.69,-2.69 -2.69,-2.69
Mechanical 15:
  lines w0.05: -4.66,-2.94 -4.66,2.94 4.66,2.94 4.66,-2.94 -4.66,-2.94
3D body "step_temp.STEP": height 2.16, standoff 0, extent -3.95,-2.64 3.95,2.64

## W25Q64JVZPIQ TR [mm] "SPI Flash Memory"
pads (9):
  rect 0.44x0.96 smd: 1(-1.905,-2.38) 2(-0.635,-2.38) 3(0.635,-2.38) 4(1.905,-2.38) 5(1.905,2.38) 6(0.635,2.38) 7(-0.635,2.38) 8(-1.905,2.38)
  rect 4.3x3.4 smd: 9(0,0)
Top Overlay:
  circle w0.3: c-2,-3.5 r0.15
Mechanical 13:
  lines w0.127: -3,-2.5 3,-2.5 ; -3,2.5 3,2.5
Mechanical 15:
  lines w0.05: -3.25,-3.25 -3.25,3.25 3.25,3.25 3.25,-3.25 -3.25,-3.25
3D body "W25Q64JVZPIQ.step": height 0.81, standoff 0, extent -2.553,-3.048 2.553,3.048

## WAGO 250-203 [mm]
pads (3):
  rect 1.65x1.65 hole 1.1: 1(0,0)
  round 1.65 hole 1.1: 2(3.5,5) 3(7,0)
Top Overlay:
  lines w0.2: -3.25,-4.7 8.75,-4.7 8.75,7.3 -3.25,7.3 -3.25,-4.7
Mechanical 13:
  lines w0.127: -3.25,-4.7 8.75,-4.7 8.75,7.3 -3.25,7.3 -3.25,-4.7
Mechanical 15:
  lines w0.1: -4.25,-5.7 9.75,-5.7 9.75,8.3 -4.25,8.3 -4.25,-5.7
3D body "250-203.stp": height 13.1, standoff -3.6, extent -3.25,-4.7 8.75,7.3

## WAGO 250-205 [mm]
pads (5):
  rect 1.65x1.65 hole 1.1: 1(0,0)
  round 1.65 hole 1.1: 2(3.5,5) 3(7,0) 4(10.5,5) 5(14,0)
Top Overlay:
  lines w0.2: -3.25,-4.7 15.75,-4.7 15.75,7.3 -3.25,7.3 -3.25,-4.7
Mechanical 13:
  lines w0.127: -3.25,-4.7 15.75,-4.7 15.75,7.3 -3.25,7.3 -3.25,-4.7
Mechanical 15:
  lines w0.1: -4.25,-5.7 16.75,-5.7 16.75,8.3 -4.25,8.3 -4.25,-5.7
3D body "250-205.stp": height 13.1, standoff -3.6, extent -3.25,-4.7 15.75,7.3

## Wemos D1 Mini [mm]
pads (16):
  oval 1.6x1.8 hole 1.2: 1(0,0) 2(2.54,0) 3(5.08,0) 4(7.62,0) 5(10.16,0) 6(12.7,0) 7(15.24,0) 8(17.78,0) 9(17.78,22.86) 10(15.24,22.86) 11(12.7,22.86) 12(10.16,22.86) 13(7.62,22.86) 14(5.08,22.86) 15(2.54,22.86) 16(0,22.86)
3D body "1X8Female.step": height 8.5, standoff -3.2, extent -1.46,21.59 19.36,24.13
3D body "WeMosD1Mini.STEP": height 14.69, standoff 2.71, extent -10.308,-1.2 24.108,24.1
3D body "1X8Female.step": height 8.5, standoff -3.2, extent -1.46,-1.27 19.36,1.27

## WSON-6 2X2 [mm]
pads (7):
  rect 0.6x0.35 smd: 1(-1.05,0.65) 2(-1.05,0) 3(-1.05,-0.65) 4(1.05,-0.65) 5(1.05,0) 6(1.05,0.65)
  rect 1.1x1.7 smd: 7(0,0)
Top Overlay:
  circle w0.127: c-1.1,1.3 r0.061
Mechanical 15:
  lines w0.1: -1,0.5 -0.5,1 ; -1,-1 -1,1 1,1 1,-1 -1,-1
Mechanical 20:
  lines w0.05: -1.6,-1.3 -1.6,1.3 1.6,1.3 1.6,-1.3 -1.6,-1.3
3D body "WSON-6 2X2.stp": height 0.8, standoff 0, extent -1,-1 1,1

## WSON-8 [mm]
pads (9):
  rect 0.8x0.35 smd: 1(-1.5,0.975) 2(-1.5,0.325) 3(-1.5,-0.325) 4(-1.5,-0.975) 5(1.5,-0.975) 6(1.5,-0.325) 7(1.5,0.325) 8(1.5,0.975)
  rect 1.75x2.5 smd: 9(0,0)
Top Overlay:
  circle w0.127: c-1.5,2 r0.061
Mechanical 15:
  lines w0.1: -1.5,0.75 -0.75,1.5 ; -1.5,-1.5 -1.5,1.5 1.5,1.5 1.5,-1.5 -1.5,-1.5
Mechanical 20:
  lines w0.05: -2.125,-1.8 -2.125,1.8 2.125,1.8 2.125,-1.8 -2.125,-1.8
3D body "WSON-8.stp": height 1, standoff 0, extent -1.5,-1.5 1.5,1.5

## XTAL_ECS-120-S-4X [mm]
pads (2):
  round 1.03 hole 0.63: 1(-2.44,0) 2(2.44,0)
Top Overlay:
  lines w0.2: -5.675,-1.012 ccw(c-4.38,-1.035) -4.403,-2.33 ; -5.675,-1.01 -5.675,1.01 ; -5.675,1.012 cw(c-4.38,1.035) -4.403,2.33 ; -4.405,-2.33 4.405,-2.33 ; -4.405,2.33 4.405,2.33 ; 4.403,-2.33 ccw(c4.38,-1.035) 5.675,-1.012 ; 4.403,2.33 cw(c4.38,1.035) 5.675,1.012 ; 5.675,-1.01 5.675,1.01
Mechanical 13:
  lines w0.127: -5.675,-1.012 ccw(c-4.38,-1.035) -4.403,-2.33 ; -5.675,-1.01 -5.675,1.01 ; -5.675,1.012 cw(c-4.38,1.035) -4.403,2.33 ; -4.405,-2.33 4.405,-2.33 ; -4.405,2.33 4.405,2.33 ; 4.403,-2.33 ccw(c4.38,-1.035) 5.675,-1.012 ; 4.403,2.33 cw(c4.38,1.035) 5.675,1.012 ; 5.675,-1.01 5.675,1.01
Mechanical 15:
  lines w0.05: -6,-1.01 ccw(c-4.43,-1.01) -4.43,-2.58 4.43,-2.58 ccw(c4.43,-1.01) 6,-1.01 6,1.01 ccw(c4.43,1.01) 4.43,2.58 -4.43,2.58 ccw(c-4.43,1.01) -6,1.01 -6,-1.01
3D body "ECS-160-20-4X.STEP": height 3.5, standoff -12.7, extent -5.675,-2.325 5.675,2.325

## XTAL_ECS-160-S-4X [mm]
pads (2):
  round 1.03 hole 0.63: 1(-2.44,0) 2(2.44,0)
Top Overlay:
  lines w0.2: -5.675,-1.012 ccw(c-4.38,-1.035) -4.403,-2.33 ; -5.675,-1.01 -5.675,1.01 ; -5.675,1.012 cw(c-4.38,1.035) -4.403,2.33 ; -4.405,-2.33 4.405,-2.33 ; -4.405,2.33 4.405,2.33 ; 4.403,-2.33 ccw(c4.38,-1.035) 5.675,-1.012 ; 4.403,2.33 cw(c4.38,1.035) 5.675,1.012 ; 5.675,-1.01 5.675,1.01
Mechanical 13:
  lines w0.127: -5.675,-1.012 ccw(c-4.38,-1.035) -4.403,-2.33 ; -5.675,-1.01 -5.675,1.01 ; -5.675,1.012 cw(c-4.38,1.035) -4.403,2.33 ; -4.405,-2.33 4.405,-2.33 ; -4.405,2.33 4.405,2.33 ; 4.403,-2.33 ccw(c4.38,-1.035) 5.675,-1.012 ; 4.403,2.33 cw(c4.38,1.035) 5.675,1.012 ; 5.675,-1.01 5.675,1.01
Mechanical 15:
  lines w0.05: -6,-1.01 ccw(c-4.43,-1.01) -4.43,-2.58 4.43,-2.58 ccw(c4.43,-1.01) 6,-1.01 6,1.01 ccw(c4.43,1.01) 4.43,2.58 -4.43,2.58 ccw(c-4.43,1.01) -6,1.01 -6,-1.01
3D body "ECS-160-20-4X.STEP": height 3.5, standoff -12.7, extent -5.675,-2.325 5.675,2.325

## YX-YT9503 [mm]
pads (2):
  rect 1.3x1.3 hole 0.8: +(0,2.54)
  round 1.3 hole 0.8: -(0,-2.46)
Top Overlay:
  lines w0.2: 0,-4.46 ccw(c0,0.04) 0,4.54 ccw(c0,0.04) 0,-4.46
Mechanical 13:
  lines w0.1: 0,-4.46 ccw(c0,0.04) 0,4.54 ccw(c0,0.04) 0,-4.46
Mechanical 15:
  lines w0.1: -5.5,-5.46 -5.5,5.54 5.5,5.54 5.5,-5.46 -5.5,-5.46
3D body "YX-YT9503.STEP": height 5.5, standoff -5, extent -4.6,-4.6 4.6,4.62